# Altium footprint library Zenite_Footprints.PcbLib: 43 footprints (part 2 of 3)
Each footprint in its own frame and in the unit in brackets; x right, y up, seen from the top. Pads: shape width x height; smd on the part's side, far side on the other; paste and mask are expansions set on the pad; w line width, h text height; cw(c..) or ccw(c..) is an arc to the next point about the centre after c.
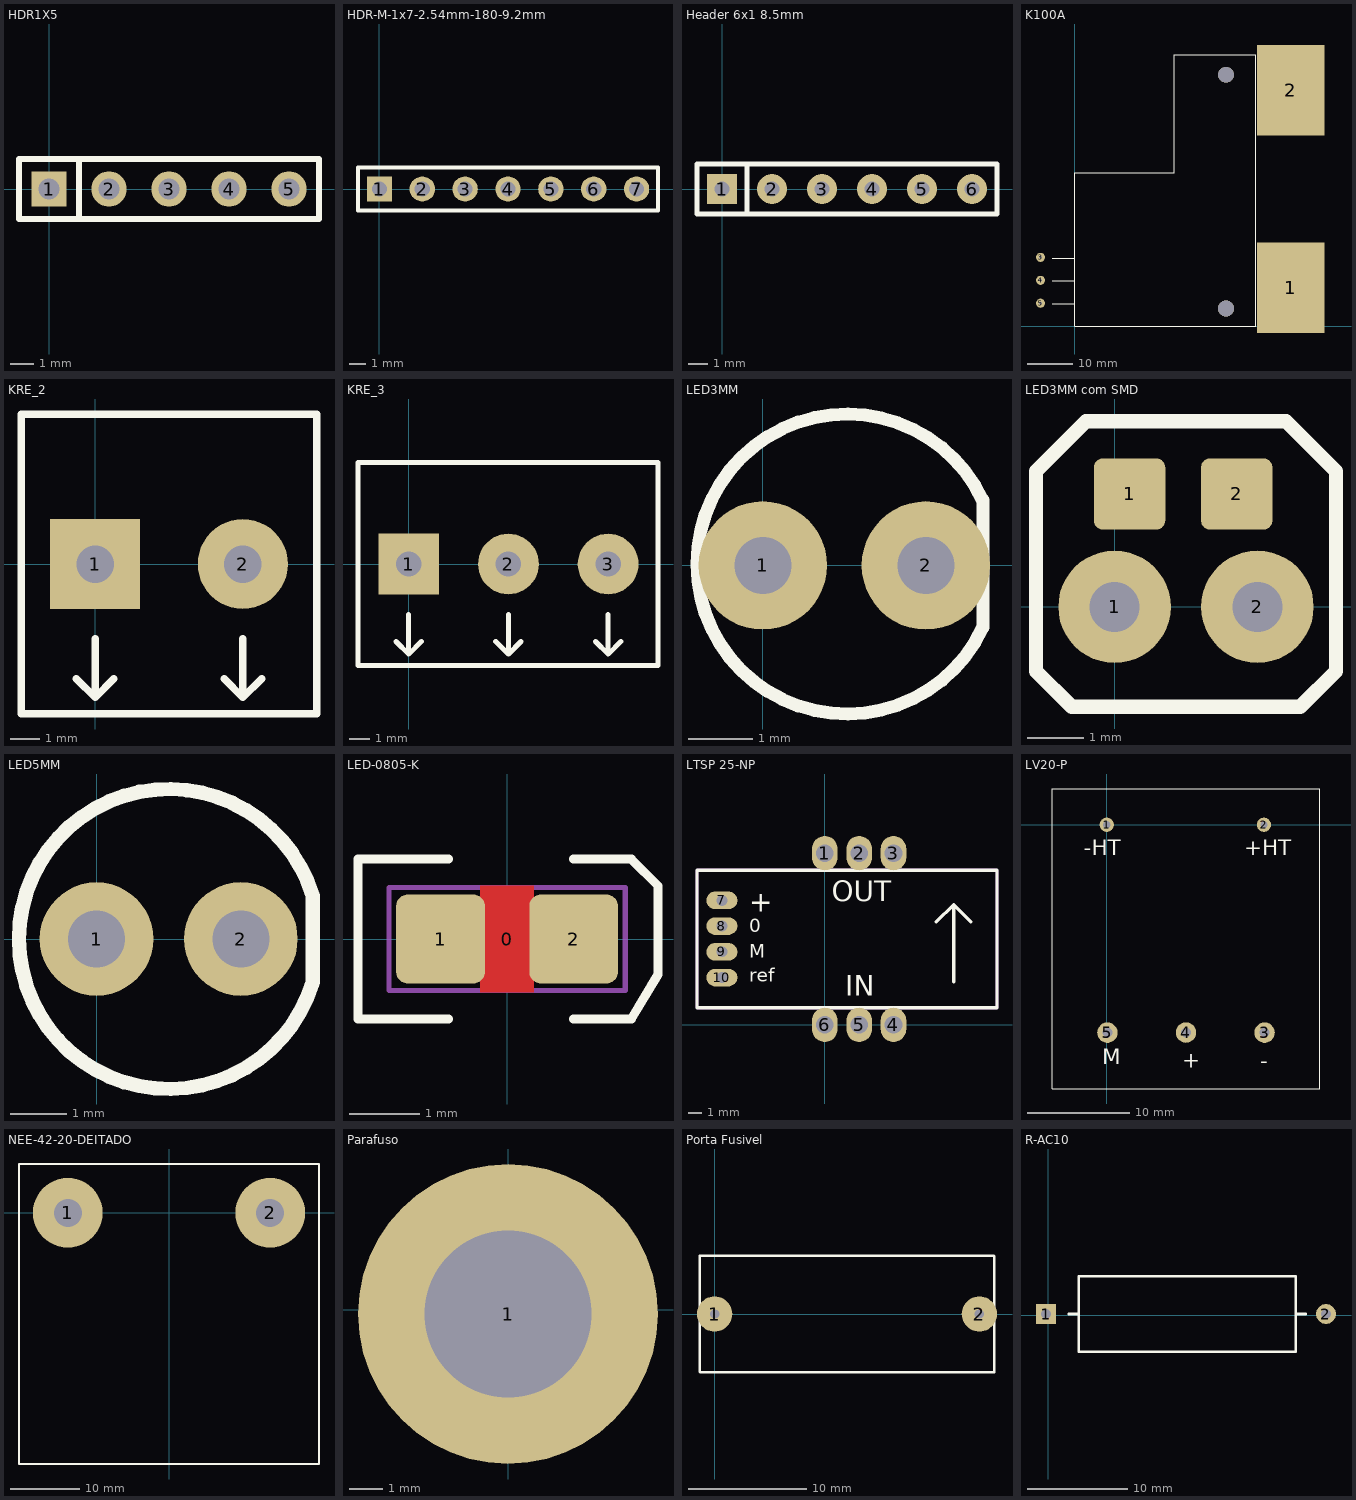
[diagram p1: the footprints below, top view; thin cyan lines are the x and y axes]

## HDR1X5 [mm] "Connector; Header; 5 Position"
pads (5):
  rect 1.5x1.5 hole 0.9: 1(0,0)
  round 1.5 hole 0.9: 2(2.54,0) 3(5.08,0) 4(7.62,0) 5(10.16,0)
Top Overlay:
  lines w0.254: 1.27,-1.27 1.27,1.27 ; -1.27,-1.27 11.43,-1.27 11.43,1.27 -1.27,1.27 -1.27,-1.27
3D body: height 8.4, standoff -3.15, extent -1.27,-1.27 11.43,1.23

## HDR-M-1x7-2.54mm-180-9.2mm [mm] "Male Header, 1 line 7 rows, 180 degrees, 9.2 mm length"
pads (7):
  rect 1.5x1.5 hole 0.9: 1(0,0)
  round 1.5 hole 0.9: 2(2.54,0) 3(5.08,0) 4(7.62,0) 5(10.16,0) 6(12.7,0) 7(15.24,0)
Top Overlay:
  lines w0.254: -1.27,-1.27 -1.27,1.27 16.51,1.27 16.51,-1.27 -1.27,-1.27
3D body: height 6.2, standoff -3, extent -1.168,-1.224 16.612,1.275

## Header 6x1 8.5mm [mil] "Stackable 6 pin header"
pads (6):
  rect 60x60 hole 30: 1(0,0)
  round 60 hole 30: 2(100,0) 3(200,0) 4(300,0) 5(400,0) 6(500,0)
Top Overlay:
  lines w10: 50,-50 550,-50 550,50 50,50 ; 50,-50 50,50 ; 50,-50 -50,-50 -50,0 -50,50 50,50
3D body: height 334.65, standoff -584.65, extent -50,-50 550,50

## K100A [mm] "Latching Relay 100A, 12V coil"
height 21
pads (5):
  rect 15x20 smd: 1(47.752,8.509) 2(47.752,52.197)
  round 2 hole 0.7: 3(-7.62,15.24) 4(-7.62,10.16) 5(-7.62,5.08)
via 33.401,3.937 diameter 3.5 hole 3.5
via 33.401,55.626 diameter 3.5 hole 3.5
Top Overlay:
  lines w0.254: -5,5 0,5 ; -5,10 0,10 ; -5,15 0,15 ; 22,60 22,34 0,34 0,0 40,0 ; 22.005,60 40.005,60 40.005,0
3D body: height 21, standoff 0, extent -0.28,0.226 45.72,60.226

## KRE_2 [mil] "Terminal Block 2 pins"
pads (2):
  rect 120x120 hole 50: 1(0,0)
  round 120 hole 50: 2(196.85,0)
Top Overlay:
  lines w10: -25,-153 0,-178 ; 0,-100 0,-178 ; 25,-153 0,-178 ; 171.85,-153 196.85,-178 ; 196.85,-100 196.85,-178 ; 221.85,-153 196.85,-178 ; -98.43,-200 -98.43,200 295.28,200 295.28,-200 -98.43,-200
3D body: height 559.07, standoff -137.8, extent -123.32,-189.76 294,215.76

## KRE_3 [mil] "Terminal Block 3 pins"
pads (3):
  rect 120x120 hole 50: 1(0,0)
  round 120 hole 50: 2(196.85,0) 3(393.7,0)
Top Overlay:
  lines w10: -25,-153 0,-178 ; 0,-100 0,-178 ; 25,-153 0,-178 ; 171.85,-153 196.85,-178 ; 196.85,-100 196.85,-178 ; 221.85,-153 196.85,-178 ; 368.7,-153 393.7,-178 ; 393.7,-100 393.7,-178 ; 418.7,-153 393.7,-178 ; -100,-200 492.13,-200 492.13,200 -100,200 -100,-200
3D body: height 559.07, standoff -137.8, extent -123.32,-189.76 490.85,215.76

## LED3MM [mm]
height 1.2
pads (2):
  round 2 hole 0.889: 1(0,0) 2(2.54,0)
Top Overlay:
  lines w0.203: 0.508,0 0.889,0 ; 1.651,0 2.032,0 ; 3.429,1.01 ccw(c1.311,0.022) 3.429,-0.965 3.429,1.016
3D body: height 5.5, standoff -3, extent -0.63,-1.9 2.87,1.9

## LED3MM com SMD [mil]
height 47.24
pads (4):
  round 78.74 hole 35: 1(0,0) 2(100,0)
  rrect25% 50x50 smd: 1(10.5,79) 2(85.5,79)
Top Overlay:
  lines w8: 20,0 35,0 ; 65,0 80,0
  lines w10: -55,-45 -30,-70 130,-70 155,-45 155,95 120,130 -20,130 -55,95 -55,-45
3D body: height 216.54, standoff -118.11, extent -24.8,-74.8 112.99,74.8

## LED5MM [mm]
height 9.552
pads (2):
  round 2 hole 1: 1(0,0) 2(2.54,0)
Top Overlay:
  lines w0.203: 0.508,0 0.889,0 ; 1.651,0 2.032,0
  lines w0.254: 3.803,-0.762 cw(c1.275,0) 3.803,0.76 3.803,-0.762
3D body: height 8.6, standoff -5, extent -1.28,-2.55 3.82,2.55

## LED-0805-K [mil]
height 31.5
pads (3):
  round 20 on Mech15: 0(0,0)
  rrect25% 50x50 smd: 1(-37.5,0) 2(37.5,0)
Top Layer:
  pour cut-out: -15,30 15,30 15,-30 -15,-30
Top Overlay:
  lines w5: -33,-45 -84,-45 -84,45 -33,45 ; 37.5,-45 70,-45 85,-20 85,30 70,45 37.5,45
Mechanical 13:
  lines w3: -66.5,-29 66.5,-29 66.5,29 -66.5,29 -66.5,-29
3D body: height 31.5, standoff 11.81, extent -28.65,-24.6 26.49,24.61
3D body: height 11.81, standoff 3.94, extent -39.37,-24.61 39.37,24.61
3D body: height 3.94, standoff 0, extent -39.37,-24.61 39.37,24.61
3D body: height 3.94, standoff 0, extent -11.81,-15.75 11.81,15.75

## LTSP 25-NP [mm] "Current Transducer (25 A)"
height 24
pads (10):
  oval 1.9x2.54 hole 1.3 unplated: 1(0,12.7) 2(2.54,12.7) 3(5.08,12.7) 4(5.08,0) 5(2.54,0) 6(0,0)
  oval 2.3x1.3 hole 0.8 unplated: 7(-7.62,9.21) 8(-7.62,7.305) 9(-7.62,5.4) 10(-7.62,3.495)
Top Overlay:
  lines w0.254: 8.255,7.62 9.525,8.89 ; 9.525,3.175 9.525,8.89 ; 10.795,7.62 9.525,8.89 ; -9.46,1.27 -9.46,11.43 12.74,11.43 12.74,1.27 -9.46,1.27
  text "IN" at 1.524,2.159 h1.52
  text "OUT" at 0.508,9.144 h1.52
  text "+" at -5.588,8.382 h1.52
  text "0" at -5.588,6.858 h1
  text "M" at -5.588,4.953 h1
  text "ref" at -5.588,3.175 h1
Mechanical 1:
  lines w0.254: -9.46,1.27 12.74,1.27 12.74,11.43 -9.46,11.43 -9.46,1.27
3D body: height 24.02, standoff -3.48, extent -9.488,-0.286 12.712,13.214

## LV20-P [mm] "TRANSDUCR VOLTAG CLOSE LOOP 10MA"
height 15.1
pads (5):
  round 1.4 hole 0.7: 1(0,0) 2(15.369,0)
  round 2 hole 1: 3(15.434,-20.329) 4(7.749,-20.32) 5(0.065,-20.329)
Top Overlay:
  lines w0.102: -5.306,-25.841 -5.306,3.496 20.805,3.496 20.805,-25.841 -5.306,-25.841
  text "-" at 14.996,-23.831 h1.52
  text "+" at 7.394,-23.784 h1.52
  text "M" at -0.434,-23.43 h1.52
  text "-HT" at -2.264,-2.97 h1.52
  text "+HT" at 13.447,-2.97 h1.52
3D body: height 15.1, standoff -4.5, extent -5.251,-25.76 20.749,3.44

## NEE-42-20-DEITADO [mm]
pads (2):
  round 10 hole 4: 1(-14.5,0) 2(14.5,0)
Top Overlay:
  lines w0.254: -21.5,-36 -21.5,7 21.5,7 21.5,-36 -21.5,-36
3D body: height 23.46, standoff -3.18, extent -15.55,-28.1 15.45,4.9

## Parafuso [mm]
pads (1):
  round 9 hole 5: 1(0,-0.127)
3D body: height 4.74, standoff 0.02, extent -4.749,-5.737 5.003,5.461
3D body: height 4.02, standoff -19.98, extent -4.848,-5.918 5.152,5.629

## Porta Fusivel [mm]
pads (2):
  round 3 hole 0.8: 1(0,0) 2(22.5,0)
Top Overlay:
  lines w0.2: -1.27,-4.9 -1.27,4.9 ; -1.27,4.953 23.73,4.953 ; -1.23,-4.953 23.77,-4.953 ; 23.77,-4.9 23.77,4.9
3D body: height 12.5, standoff -3.5, extent -0.9,-4.8 23.5,4.6
3D body: height 12.6, standoff 7.4, extent 1.2,-2.7 21.2,2.5

## R-AC10 [mm] "Cemented Wirewound Resistor 10 W"
pads (2):
  rect 2x2 hole 1: 1(-0.216,0.127)
  round 2 hole 1: 2(27.72,0.127)
Top Overlay:
  lines w0.254: 2.038,0.127 3.038,0.127 ; 3.038,-3.623 3.038,0.127 ; 3.038,3.877 3.038,0.127 ; 3.048,-3.623 24.72,-3.623 24.72,0.127 ; 3.048,3.877 24.72,3.877 24.72,0.127 ; 25.72,0.127 24.72,0.127
3D body: height 9.01, standoff -3, extent -0.654,-2.794 28.086,3.206